# Altium footprint library Mi Libreria.PcbLib: 184 footprints (part 4 of 12)
Each footprint in its own frame and in the unit in brackets; x right, y up, seen from the top. Pads: shape width x height; smd on the part's side, far side on the other; paste and mask are expansions set on the pad; w line width, h text height; cw(c..) or ccw(c..) is an arc to the next point about the centre after c.
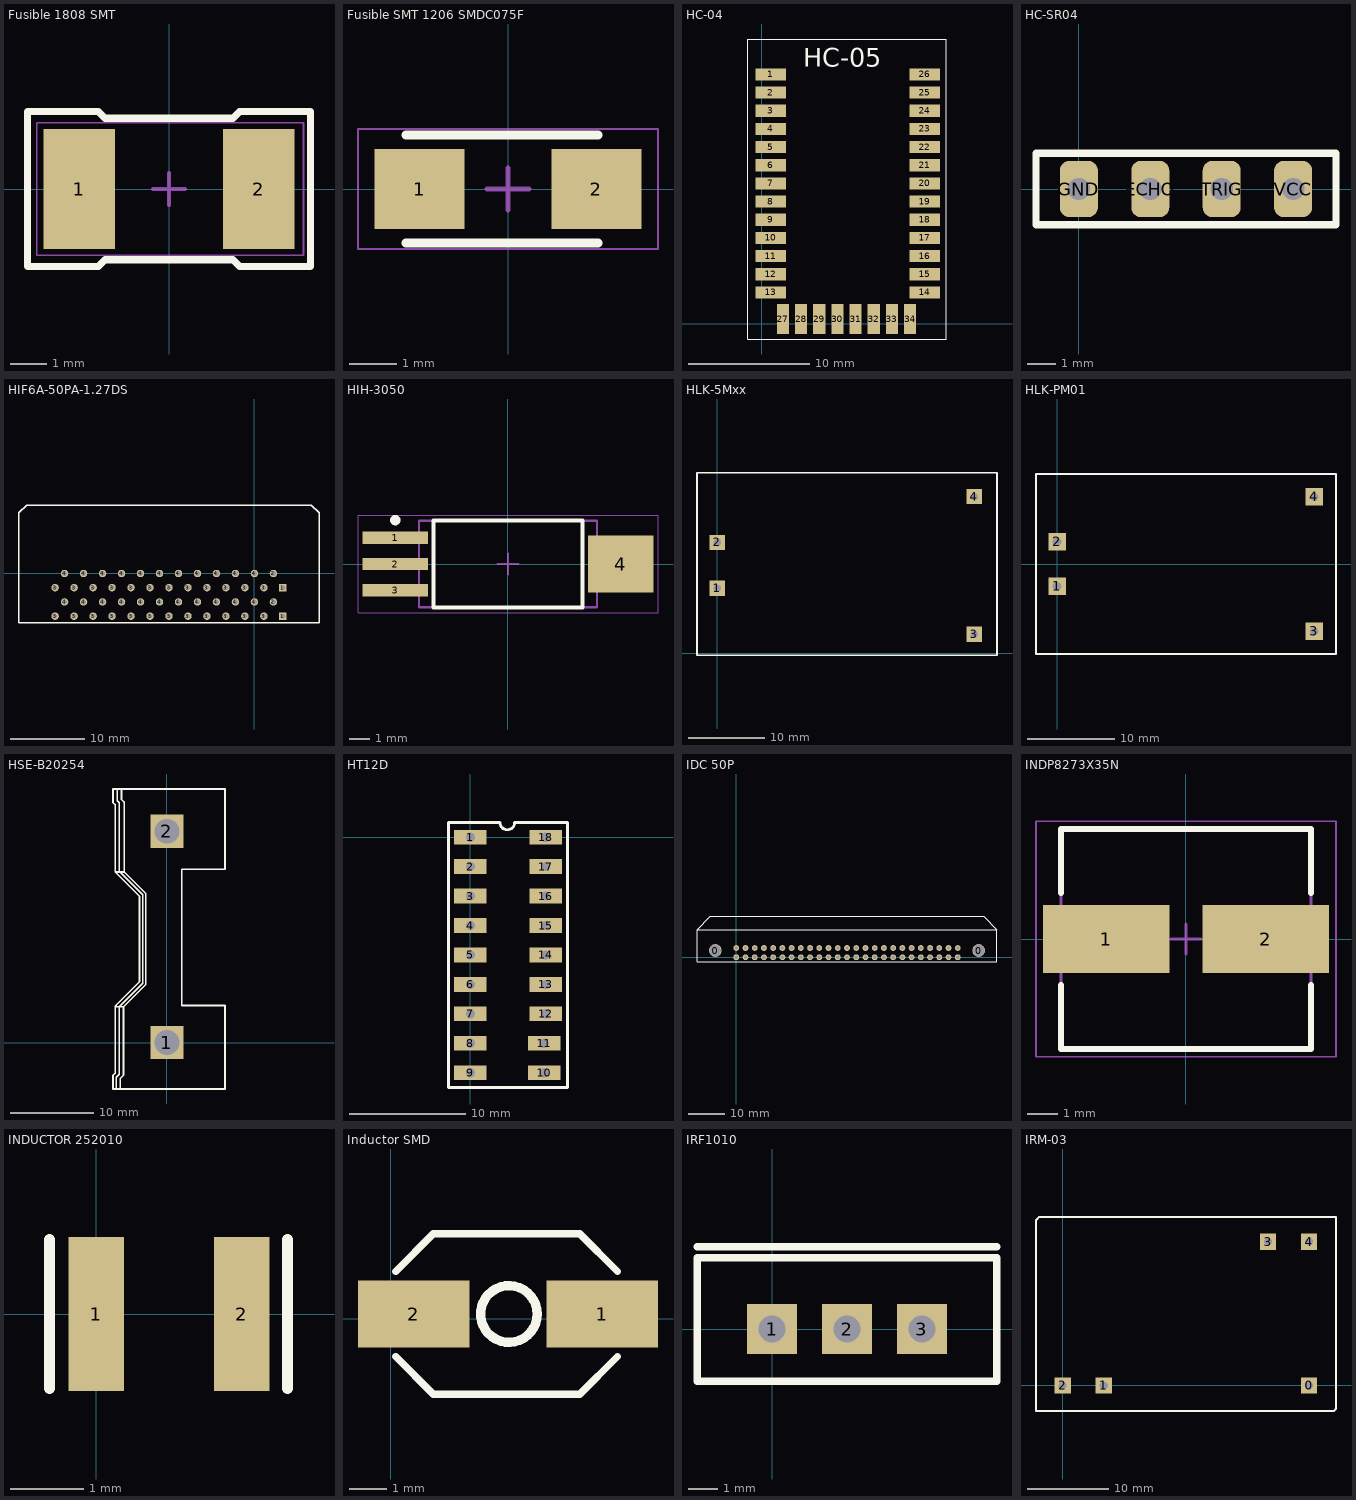
[diagram p3: the footprints below, top view; thin cyan lines are the x and y axes]

## Fusible 1808 SMT [mm] "SMT 1808 Fuse"
pads (2):
  rect 2x3.35 smd: 1(-2.5,0) 2(2.5,0)
Top Overlay:
  lines w0.2: -3.937,-2.159 -3.937,2.159 -1.968,2.159 -1.778,1.968 1.778,1.968 1.968,2.159 3.937,2.159 3.937,-2.159 1.968,-2.159 1.778,-1.968 -1.778,-1.968 -1.968,-2.159 -3.937,-2.159
Mechanical 15:
  lines w0.05: -3.683,-1.841 3.746,-1.841 3.746,1.841 -3.683,1.841 -3.683,-1.841
  lines w0.1: -0.45,0 0.45,0 ; 0,-0.45 0,0.45
3D body "fuse1808.step": height 2.69, standoff 0, extent -3.05,-1.333 3.05,1.356

## Fusible SMT 1206 SMDC075F [mm] "SMDC075F Surface mount Fuse 1206 Resseteable"
pads (2):
  rect 1.9x1.7 smd: 1(-1.873,0) 2(1.873,0)
Top Overlay:
  lines w0.2: -2.159,-1.143 1.905,-1.143 ; -2.159,1.143 1.905,1.143
Mechanical 15:
  lines w0.05: -3.175,-1.27 3.175,-1.27 3.175,1.27 -3.175,1.27 -3.175,-1.27
  lines w0.1: -0.45,0 0.45,0 ; 0,-0.45 0,0.45
3D body "FUSIBLE 1206 SMD075F.step": height 0.56, standoff 0, extent -1.601,-0.826 1.601,0.826

## HC-04 [mm] "ADAPTER SMD"
height 1.5
pads (34):
  rect 2.5x1 smd: 1(0.762,20.574) 2(0.762,19.074) 3(0.762,17.574) 4(0.762,16.074) 5(0.762,14.574) 6(0.762,13.074) 7(0.762,11.574) 8(0.762,10.074) 9(0.762,8.574) 10(0.762,7.074) 11(0.762,5.574) 12(0.762,4.074) 13(0.762,2.574) 14(13.462,2.574) 15(13.462,4.074) 16(13.462,5.574) 17(13.462,7.074) 18(13.462,8.574) 19(13.462,10.074) 20(13.462,11.574) 21(13.462,13.074) 22(13.462,14.574) 23(13.462,16.074) 24(13.462,17.574) 25(13.462,19.074) 26(13.462,20.574)
  rect 1x2.5 smd: 27(1.754,0.374) 28(3.254,0.374) 29(4.754,0.374) 30(6.254,0.374) 31(7.754,0.374) 32(9.254,0.374) 33(10.754,0.374) 34(12.254,0.374)
Top Overlay:
  lines w0.1: 6.858,23.495 6.731,23.495 ; 6.731,23.495 8.509,23.495 15.24,23.495 15.24,-1.27 -1.143,-1.27 -1.143,23.495 6.731,23.495
  text "HC-05" at 3.429,21.209 h1.52
3D body "HC-06_.step": height 2.35, standoff 0, extent -0.01,0.814 14.01,28.824

## HC-SR04 [mm] "Ultrasonic Sensor Module"
pads (4):
  rrect50% 1.35x2 hole 0.8: ECHO(2.54,0) GND(0,0) TRIG(5.08,0) VCC(7.62,0)
Top Overlay:
  lines w0.254: -1.524,-1.27 -1.524,1.27 9.144,1.27 9.144,-1.27 -1.524,-1.27
3D body "HH4X1.stp": height 9, standoff -2.7, extent -1.397,-1.25 9.013,1.25
3D body "HC-SR04.stp": height 29.8, standoff 3.76, extent -18.838,-0.227 26.162,18.026

## HIF6A-50PA-1.27DS [mm] "HIF6A-50PA-1.27DS Connector PQ"
pads (50):
  rect 1x1 hole 0.625: 1(3.81,-5.71) 1(3.81,-1.9)
  round 1 hole 0.625: 2(2.54,-3.81) 2(2.54,0) 3(-26.67,-5.71) 3(-26.67,-1.9) 3(-24.13,-5.71) 3(-24.13,-1.9) 3(-21.59,-5.71) 3(-21.59,-1.9) 3(-19.05,-5.71) 3(-19.05,-1.9) 3(-16.51,-5.71) 3(-16.51,-1.9) 3(-13.97,-5.71) 3(-13.97,-1.9) 3(-11.43,-5.71) 3(-11.43,-1.9) 3(-8.89,-5.71) 3(-8.89,-1.9) 3(-6.35,-5.71) 3(-6.35,-1.9) 3(-3.81,-5.71) 3(-3.81,-1.9) 3(-1.27,-5.71) 3(-1.27,-1.9) 3(1.27,-5.71) 3(1.27,-1.9) 4(-25.4,-3.81) 4(-25.4,0) 4(-22.86,-3.81) 4(-22.86,0) 4(-20.32,-3.81) 4(-20.32,0) 4(-17.78,-3.81) 4(-17.78,0) 4(-15.24,-3.81) 4(-15.24,0) 4(-12.7,-3.81) 4(-12.7,0) 4(-10.16,-3.81) 4(-10.16,0) 4(-7.62,-3.81) 4(-7.62,0) 4(-5.08,-3.81) 4(-5.08,0) 4(-2.54,-3.81) 4(-2.54,0) 4(0,-3.81) 4(0,0)
Top Overlay:
  lines w0.2: -31.496,-6.604 -31.496,8.128 -30.48,9.144 7.62,9.144 8.636,8.128 8.636,-6.604 -31.496,-6.604
3D body "HIF6A-50PA-1.27DS.stp": height 9.86, standoff -2.14, extent -31.43,-6.483 8.57,9.017

## HIH-3050 [mm] "SENSOR DE HUMEDAD"
height 1.8
pads (4):
  rect 3.15x0.6 smd: 1(-5.45,1.27) 2(-5.45,0) 3(-5.45,-1.27)
  rect 3.15x2.75 smd: 4(5.45,0)
Top Overlay:
  circle w0.25: c-5.45,2.12 r0.125
  lines w0.2: -3.6,-2.1 -3.6,2.1 3.6,2.1 3.6,-2.1 -3.6,-2.1
Mechanical 13:
  lines w0.1: -4.3,-2.09 -4.3,2.09 4.3,2.09 4.3,-2.09 -4.3,-2.09
Mechanical 15:
  lines w0.05: -7.25,-2.35 -7.25,2.35 7.25,2.35 7.25,-2.35 -7.25,-2.35
  lines w0.1: -0.5,0 0.5,0 ; 0,-0.5 0,0.5
3D body: height 1.8, standoff 0.02, extent -4.3,-2.09 4.3,2.09

## HLK-5Mxx [mm] "HLK-5M AC-DC Converter 5W"
pads (4):
  rect 2x2 hole 1: 1(0,8.5) 2(0,14.5) 3(33.6,2.5) 4(33.6,20.5)
Top Overlay:
  lines w0.254: -2.667,-0.254 36.576,-0.254 36.576,23.622 -2.667,23.622 -2.667,-0.254
3D body "Convertidor AC DC HLK-5M05 .step": height 19.15, standoff -4.15, extent -2.409,0 36.191,23.3

## HLK-PM01 [mm] "HLK-PM01 AC-DC Converter"
pads (4):
  rect 2x2 hole 1: 1(0,-2.54) 2(0,2.54) 3(29.4,-7.7) 4(29.4,7.7)
Top Overlay:
  lines w0.254: -2.413,-10.287 -2.413,10.287 31.877,10.287 31.877,-10.287 -2.413,-10.287
3D body: height 3, standoff -2, extent -0.347,2.191 0.35,2.89
3D body: height 3, standoff -2, extent 29.053,-8.049 29.75,-7.35
3D body: height 3, standoff -2, extent 29.053,7.351 29.75,8.05
3D body: height 3, standoff -2, extent -0.347,-2.889 0.35,-2.19
3D body: height 15.5, standoff 0.5, extent -2.159,-10.033 31.623,10.033

## HSE-B20254 [mm] "Heat Sink 5.5W TO 220"
pads (2):
  rect 4x4 hole 3: 1(0,0) 2(0,25.4)
Top Overlay:
  lines w0.2: -6.096,-5.588 -6.096,-4.191 -5.715,-3.81 -5.715,4.223 -5.715,4.318 -2.921,7.112 -2.921,17.78 -5.683,20.542 -5.715,20.542 -5.715,28.829 -5.969,29.083 -5.969,30.48 ; -5.588,-5.588 -5.588,-4.318 -5.207,-3.937 -5.207,4.318 ; -6.223,4.381 -6.096,4.381 -6.032,4.318 -5.207,4.318 ; -6.223,4.381 -6.223,-3.683 -6.477,-3.937 -6.477,-5.588 -5.207,-5.588 6.985,-5.588 6.985,4.445 1.778,4.445 1.778,20.828 6.985,20.828 6.985,30.48 -5.461,30.48 ; -6.223,4.381 -3.302,7.302 -3.302,17.59 -6.223,20.511 ; -6.223,20.511 -5.143,20.511 ; -6.223,20.511 -6.223,28.575 -6.477,28.829 -6.477,30.48 -5.461,30.48 ; -5.461,30.48 -5.461,29.21 -5.143,28.892 -5.143,20.511 ; -5.207,4.318 -2.54,6.985 -2.54,17.907 -5.143,20.511
3D body "HSE-B20254-035H-02.step": height 26.4, standoff -2.5, extent -6.223,-5.052 6.477,29.946

## HT12D [mil]
pads (18):
  rect 110x50 / inner rect 100x50 / far side rect 110x50 hole 31.5: 1(0,0) 2(0,-100) 3(0,-200) 4(0,-300) 5(0,-400) 6(0,-500) 7(0,-600) 8(0,-700) 9(0,-800) 10(250,-800) 11(250,-700) 12(255,-600) 13(255,-500) 14(255,-400) 15(255,-300) 16(255,-200) 17(255,-100) 18(255,0)
Top Overlay:
  lines w10: -75,-850 330,-850 330,50 150,50 cw(c125,50) 100,50 -75,50 -75,-850

## IDC 50P [mm] "Conector IDC 50P con seguro"
pads (52):
  round 3.5 hole 3.2: 0(-5.75,1.84) 0(66.71,1.84)
  round 1.6 hole 0.925: 1(0,0) 2(0,2.54) 3(2.54,0) 4(2.54,2.54) 5(5.08,0) 6(5.08,2.54) 7(7.62,0) 8(7.62,2.54) 9(10.16,0) 10(10.16,2.54) 11(12.7,0) 12(12.7,2.54) 13(15.24,0) 14(15.24,2.54) 15(17.78,0) 16(17.78,2.54) 17(20.32,0) 18(20.32,2.54) 19(22.86,0) 20(22.86,2.54) 21(25.4,0) 22(25.4,2.54) 23(27.94,0) 24(27.94,2.54) 25(30.48,0) 26(30.48,2.54) 27(33.02,0) 28(33.02,2.54) 29(35.56,0) 30(35.56,2.54) 31(38.1,0) 32(38.1,2.54) 33(40.64,0) 34(40.64,2.54) 35(43.18,0) 36(43.18,2.54) 37(45.72,0) 38(45.72,2.54) 39(48.26,0) 40(48.26,2.54) 41(50.8,0) 42(50.8,2.54) 43(53.34,0) 44(53.34,2.54) 45(55.88,0) 46(55.88,2.54) 47(58.42,0) 48(58.42,2.54) 49(60.96,0) 50(60.96,2.54)
Top Overlay:
  lines w0.2: -10.795,7.62 -7.112,11.303 68.072,11.303 71.755,7.62 ; -10.795,7.62 -10.795,-1.27 71.755,-1.27 71.755,7.62 ; -10.795,7.62 71.755,7.62
3D body "XG4A_5034.step": height 9.35, standoff -2.35, extent -10.92,-1.27 71.88,25.73

## INDP8273X35N [mm] "Precision Wire Wound Inductor, 2-Leads, Body 8.15x7.30mm, IPC Medium Density"
height 3.5
pads (2):
  rect 4.2x2.25 smd: 1(-2.65,0) 2(2.65,0)
Top Overlay:
  lines w0.2: -4.15,-1.525 -4.15,-3.65 4.15,-3.65 4.15,-1.525 ; -4.15,1.525 -4.15,3.65 4.15,3.65 4.15,1.525
Mechanical 13:
  lines w0.1: -4.15,-3.65 -4.15,3.65 4.15,3.65 4.15,-3.65 -4.15,-3.65
Mechanical 15:
  lines w0.05: -4.975,-3.9 -4.975,3.9 4.975,3.9 4.975,-3.9 -4.975,-3.9
  lines w0.1: -0.5,0 0.5,0 ; 0,-0.5 0,0.5
3D body: height 3.5, standoff 0, extent -4.15,-3.65 4.15,3.65

## INDUCTOR 252010 [mm] "Inductor SMD 2.5x2x1mm"
pads (2):
  rect 0.75x2.1 smd: 1(0,0) 2(1.981,0)
Top Overlay:
  lines w0.15: -0.635,-1.016 -0.635,1.016 ; 2.6,-1.016 2.6,1.016
3D body: height 0.25, standoff 0, extent -0.317,-1.016 0.064,1.016
3D body: height 0.25, standoff 0, extent 1.842,-1.016 2.223,1.016
3D body: height 1, standoff 0, extent -0.127,-1.016 2.032,1.016

## Inductor SMD [mm] "SMT Inductor 6.6x4.45x2.92mm"
pads (2):
  rect 3x1.8 smd: 1(5.685,0.127) 2(0.615,0.127)
Top Overlay:
  circle w0.254: c3.175,0.127 r0.762
  lines w0.2: 0.127,-1.016 1.143,-2.032 5.08,-2.032 6.096,-1.016 ; 0.127,1.27 1.143,2.286 5.08,2.286 6.096,1.27
3D body "Inductor Mini SMD.STEP": height 2.91, standoff 0, extent -0.125,-2.098 6.475,2.352

## IRF1010 [mm] "Mosfet N TO-220"
pads (3):
  rect 1.7x1.7 hole 0.9: 1(0,0) 2(2.54,0) 3(5.08,0)
Top Overlay:
  lines w0.254: -2.54,2.794 7.62,2.794 ; -2.54,-1.778 7.62,-1.778 7.62,2.413 -2.54,2.413 -2.54,-1.778
3D body "TO-220-4.STEP": height 22.06, standoff -6.74, extent -2.56,-1.833 7.64,2.667

## IRM-03 [mm] "AC-DC Converter"
pads (5):
  rect 2x2 hole 1: 0(30.48,0) 1(5.08,0) 2(0,0) 3(25.4,17.78) 4(30.48,17.78)
Top Overlay:
  lines w0.254: -3.302,-3.175 33.528,-3.175 33.8,-2.903 33.8,20.85 ; -3.3,-3.15 -3.3,20.449 -2.899,20.85 33.778,20.85
3D body: height 3, standoff -2, extent -0.448,-0.517 0.448,0.381
3D body: height 3, standoff -2, extent 30.034,-0.449 30.93,0.449
3D body: height 3, standoff -2, extent 24.954,17.331 25.85,18.229
3D body: height 3, standoff -2, extent 4.634,-0.449 5.53,0.449
3D body: height 3, standoff -2, extent 30.034,17.331 30.93,18.229
3D body: height 15, standoff 0.5, extent -3.048,-2.921 33.528,20.574